# Altium footprint library Nhat_Lib.PcbLib: 84 footprints (part 3 of 6)
Each footprint in its own frame and in the unit in brackets; x right, y up, seen from the top. Pads: shape width x height; smd on the part's side, far side on the other; paste and mask are expansions set on the pad; w line width, h text height; cw(c..) or ccw(c..) is an arc to the next point about the centre after c.
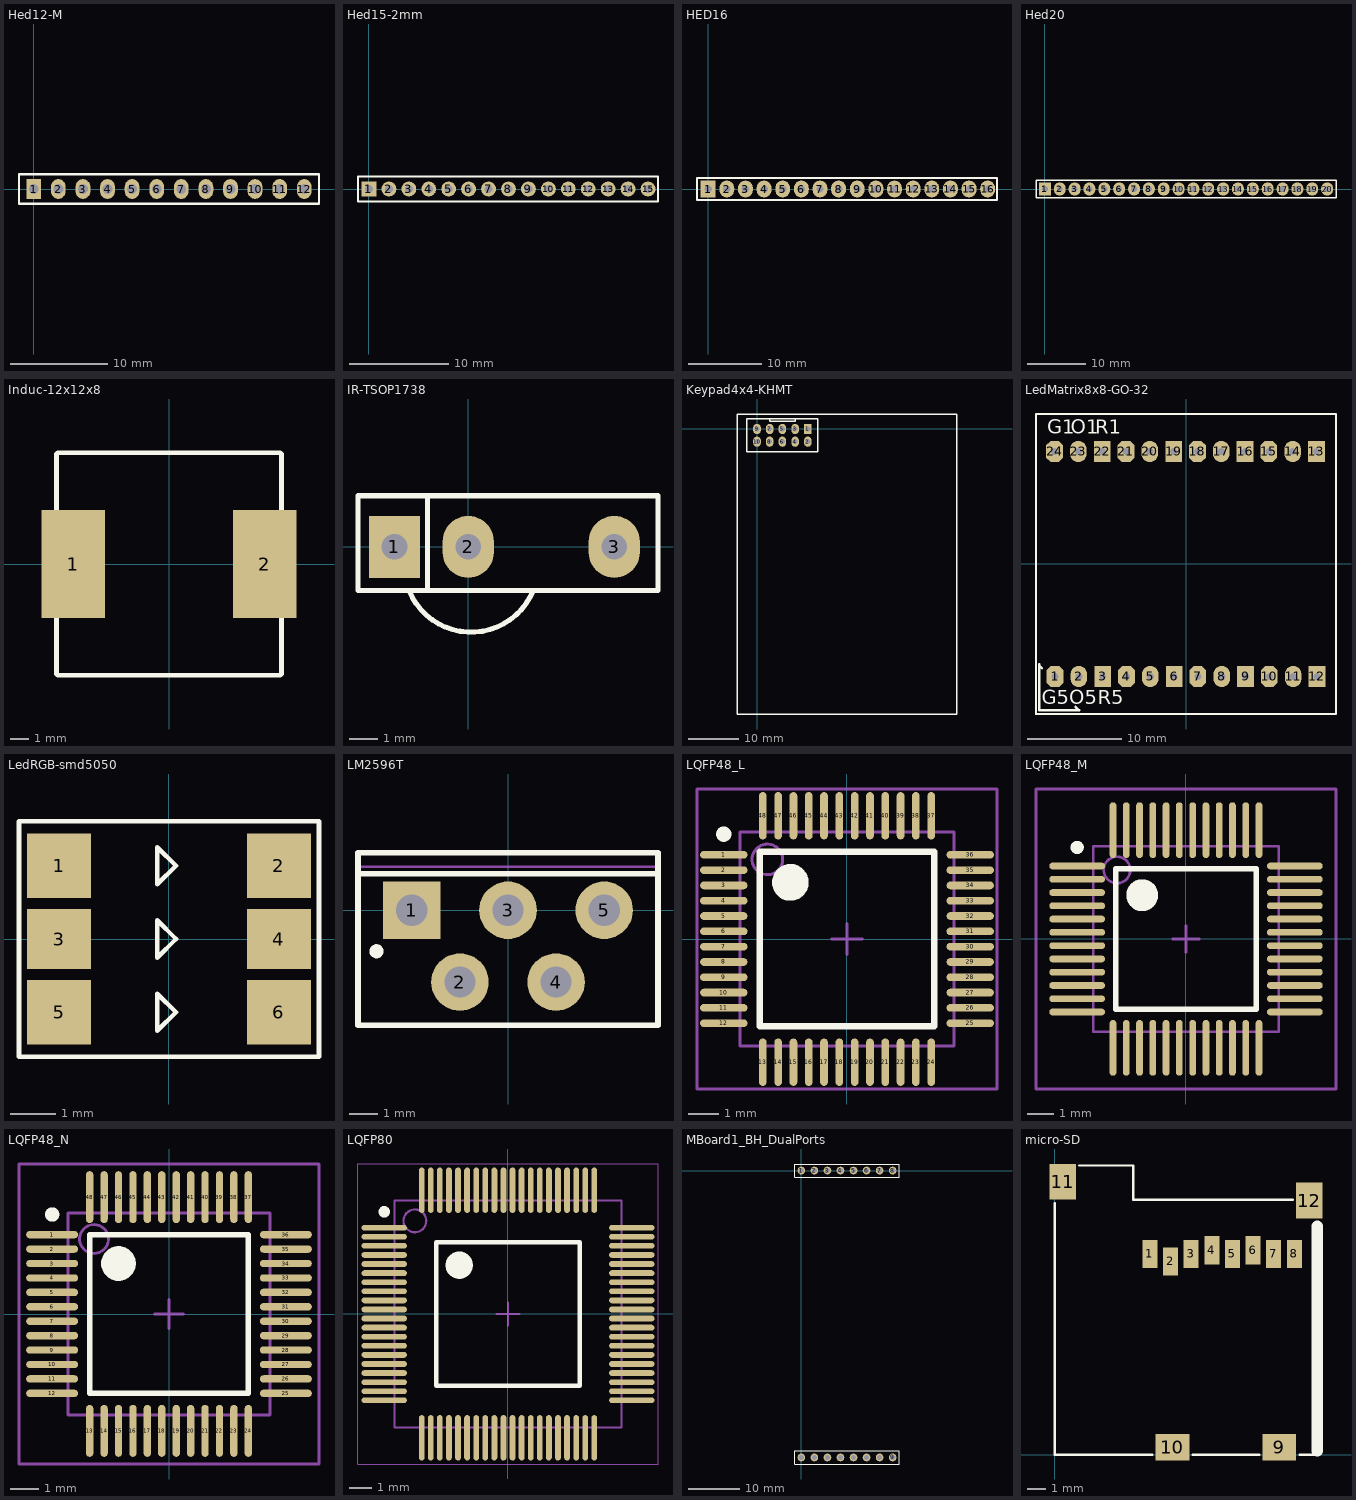
[diagram p2: the footprints below, top view; thin cyan lines are the x and y axes]

## Hed12-M [mil]
pads (12):
  rect 60x80 hole 40: 1(0,0)
  oval 60x80 hole 40: 2(100,0) 3(200,0) 4(300,0) 5(400,0) 6(500,0) 7(600,0) 8(700,0) 9(800,0) 10(900,0) 11(1000,0) 12(1100,0)
Top Overlay:
  lines w10: -60,-60 1160,-60 1160,60 -60,60 -60,-60
3D body: height 314.96, standoff -39.37, extent -10,-10 10,10
3D body: height 314.96, standoff -39.37, extent 90,-10 110,10
3D body: height 314.96, standoff -39.37, extent 190,-10 210,10
3D body: height 314.96, standoff -39.37, extent 290,-10 310,10
3D body: height 314.96, standoff -39.37, extent 390,-10 410,10
3D body: height 314.96, standoff -39.37, extent 490,-10 510,10
3D body: height 314.96, standoff -39.37, extent 590,-10 610,10
3D body: height 314.96, standoff -39.37, extent 690,-10 710,10
3D body: height 314.96, standoff -39.37, extent 790,-10 810,10
3D body: height 314.96, standoff -39.37, extent 890,-10 910,10
3D body: height 314.96, standoff -39.37, extent 990,-10 1010,10
3D body: height 314.96, standoff -39.37, extent 1090,-10 1110,10
3D body: height 78.74, standoff 0, extent -50,-50 50,50
3D body: height 78.74, standoff 0, extent 50,-50 150,50
3D body: height 78.74, standoff 0, extent 150,-50 250,50
3D body: height 78.74, standoff 0, extent 250,-50 350,50
3D body: height 78.74, standoff 0, extent 350,-50 450,50
3D body: height 78.74, standoff 0, extent 450,-50 550,50
3D body: height 78.74, standoff 0, extent 550,-50 650,50
3D body: height 78.74, standoff 0, extent 650,-50 750,50
3D body: height 78.74, standoff 0, extent 750,-50 850,50
3D body: height 78.74, standoff 0, extent 850,-50 950,50
3D body: height 78.74, standoff 0, extent 950,-50 1050,50
3D body: height 78.74, standoff 0, extent 1050,-50 1150,50

## Hed15-2mm [mm]
pads (15):
  rect 1.5x1.5 hole 0.8: 1(0,0)
  round 1.5 hole 0.8: 2(2,0) 3(4,0) 4(6,0) 5(8,0) 6(10,0) 7(12,0) 8(14,0) 9(16,0) 10(18,0) 11(20,0) 12(22,0) 13(24,0) 14(26,0) 15(28,0)
Top Overlay:
  lines w0.203: -1.1,-1.25 -1.1,1.25 29,1.25 29,-1.25 -1.1,-1.25
3D body: height 4.3, standoff 0, extent 27,-1.2 29,0
3D body: height 4.3, standoff 0, extent 27,0 29,1.2
3D body: height 4.3, standoff 0, extent 25,-1.2 27,0
3D body: height 4.3, standoff 0, extent 25,0 27,1.2
3D body: height 4.3, standoff 0, extent 23,-1.2 25,0
3D body: height 4.3, standoff 0, extent 23,0 25,1.2
3D body: height 4.3, standoff 0, extent 21,-1.2 23,0
3D body: height 4.3, standoff 0, extent 21,0 23,1.2
3D body: height 4.3, standoff 0, extent 19,-1.2 21,0
3D body: height 4.3, standoff 0, extent 19,0 21,1.2
3D body: height 4.3, standoff 0, extent -1,0 1,1.2
3D body: height 4.3, standoff 0, extent -1,-1.2 1,0
3D body: height 4.3, standoff 0, extent 1,-1.2 3,0
3D body: height 4.3, standoff 0, extent 1,0 3,1.2
3D body: height 4.3, standoff 0, extent 5,0 7,1.2
3D body: height 4.3, standoff 0, extent 5,-1.2 7,0
3D body: height 4.3, standoff 0, extent 3,-1.2 5,0
3D body: height 4.3, standoff 0, extent 3,0 5,1.2
3D body: height 4.3, standoff 0, extent 11,0 13,1.2
3D body: height 4.3, standoff 0, extent 11,-1.2 13,0
3D body: height 4.3, standoff 0, extent 13,-1.2 15,0
3D body: height 4.3, standoff 0, extent 13,0 15,1.2
3D body: height 4.3, standoff 0, extent 9,0 11,1.2
3D body: height 4.3, standoff 0, extent 9,-1.2 11,0
3D body: height 4.3, standoff 0, extent 7,-1.2 9,0
3D body: height 4.3, standoff 0, extent 7,0 9,1.2
3D body: height 4.3, standoff 0, extent 17,0 19,1.2
3D body: height 4.3, standoff 0, extent 17,-1.2 19,0
3D body: height 4.3, standoff 0, extent 15,-1.2 17,0
3D body: height 4.3, standoff 0, extent 15,0 17,1.2

## HED16 [mil]
pads (16):
  rect 80x90 hole 40: 1(0,0)
  oval 80x90 hole 40: 2(100,0) 3(200,0) 4(300,0) 5(400,0) 6(500,0) 7(600,0) 8(700,0) 9(800,0) 10(900,0) 11(1000,0) 12(1100,0) 13(1200,0) 14(1300,0) 15(1400,0) 16(1500,0)
Top Overlay:
  lines w10: 940,-60 1550,-60 1550,60 940,60 ; 960,-60 -60,-60 -60,60 960,60

## Hed20 [mil] "Header 20 pin 2.54mm"
pads (20):
  rect 80x90 hole 40: 1(0,0)
  oval 80x90 hole 40: 2(100,0) 3(200,0) 4(300,0) 5(400,0) 6(500,0) 7(600,0) 8(700,0) 9(800,0) 10(900,0) 11(1000,0) 12(1100,0) 13(1200,0) 14(1300,0) 15(1400,0) 16(1500,0) 17(1600,0) 18(1700,0) 19(1800,0) 20(1900,0)
Top Overlay:
  lines w10: 940,-60 1960,-60 1960,60 940,60 ; 960,-60 -60,-60 -60,60 960,60

## Induc-12x12x8 [mm]
pads (2):
  rect 3.5x6 smd: 1(-5.3,0) 2(5.3,0)
Top Overlay:
  lines w0.254: -6.223,-6.096 -6.223,6.096 ; -6.15,-6.15 6.15,-6.15 ; -6.15,6.15 6.15,6.15 ; 6.223,-6.096 6.223,6.096

## IR-TSOP1738 [mil]
pads (3):
  rect 70x85 hole 35: 1(-101,0)
  oval 70x85 hole 35: 2(0,0) 3(200,0)
Top Overlay:
  lines w7: -81,-60 ccw(c4,-25) 89,-60 ; -56,-60 -56,70 ; -151,-60 -151,70 260,70 260,-60 -151,-60

## Keypad4x4-KHMT [mil]
pads (10):
  rect 60x80 hole 40: 1(400,0)
  oval 60x80 hole 40: 2(400,-100) 3(300,0) 4(300,-100) 5(200,0) 6(200,-100) 7(100,0) 8(100,-100) 9(0,0) 10(0,-100)
Top Overlay:
  lines w10: 100,80 300,80 ; 100,80 100,60 300,60 300,80 ; 100,80 -80,80 -80,-180 480,-180 480,80 300,80 ; -157.48,-2244.09 -157.48,118.11 1574.8,118.11 1574.8,-2244.09 -157.48,-2244.09

## LedMatrix8x8-GO-32 [mil]
pads (24):
  oct 70x90 hole 30: 1(-550,-472.44) 4(-250,-472.44) 7(50,-472.44) 10(350,-472.44) 15(348,472.44) 18(48,472.44) 21(-252,472.44) 24(-552,472.44)
  oval 70x90 hole 30: 2(-450,-472.44) 5(-150,-472.44) 8(150,-472.44) 11(450,-472.44) 14(448,472.44) 17(148,472.44) 20(-152,472.44) 23(-452,472.44)
  rect 70x90 hole 30: 3(-350,-472.44) 6(-50,-472.44) 9(250,-472.44) 12(550,-472.44) 13(548,472.44) 16(248,472.44) 19(-52,472.44) 22(-352,472.44)
Top Overlay:
  lines w10: -629.84,-630 -629.92,-629.92 ; -605,-438 -617,-426 -617,-420 -617,-615 -449,-615 -464,-600 ; -629.92,-629.92 629.92,-629.92 629.92,629.92 -629.92,629.92 -629.92,-629.92
  text "R5" at -371,-589 h60
  text "O5" at -490,-589 h60
  text "G5" at -606,-589 h60
  text "G1" at -583,546 h60
  text "O1" at -483,546 h60
  text "R1" at -382,547 h60

## LedRGB-smd5050 [mm]
pads (6):
  rect 1.4x1.4 smd: 1(-2.4,1.6) 2(2.4,1.6) 5(-2.4,-1.6) 6(2.4,-1.6)
  rect 1.4x1.3 smd: 3(-2.4,0) 4(2.4,0)
Top Overlay:
  lines w0.1: -3.275,-2.575 -3.275,2.575 3.275,2.575 3.275,-2.575 -3.275,-2.575 ; -0.254,-2.006 -0.254,-1.194 0.152,-1.6 -0.254,-2.006 ; -0.254,-0.406 -0.254,0.407 0.152,0 -0.254,-0.406 ; -0.254,1.194 0.152,1.6 -0.254,2.007 -0.254,1.194
3D body: height 2, standoff 0, extent -2.7,-2.5 2.7,2.5

## LM2596T [mil]
pads (5):
  rect 80x80 hole 43.31: 1(-133.86,0)
  round 80 hole 43.31: 2(-66.93,-100) 3(0,0) 4(66.93,-100) 5(133.86,0)
Top Overlay:
  circle w9.84: c-183.07,-57.09 r4.92
  lines w7.87: -208.66,50.55 208.66,50.55 ; -208.66,-160 -208.66,80 208.66,80 208.66,-160 -208.66,-160
Mechanical 13:
  lines w3.94: -208.66,60.55 208.66,60.55 ; -208.66,-160 208.66,-160 208.66,80 -208.66,80 -208.66,-160
3D body: height 771.65, standoff 511.81, extent -208.66,60.18 208.62,79.82

## LQFP48_L [mm]
pads (48):
  oval 1.55x0.25 smd: 1(-4.025,2.75) 2(-4.025,2.25) 3(-4.025,1.75) 4(-4.025,1.25) 5(-4.025,0.75) 6(-4.025,0.25) 7(-4.025,-0.25) 8(-4.025,-0.75) 9(-4.025,-1.25) 10(-4.025,-1.75) 11(-4.025,-2.25) 12(-4.025,-2.75) 25(4.025,-2.75) 26(4.025,-2.25) 27(4.025,-1.75) 28(4.025,-1.25) 29(4.025,-0.75) 30(4.025,-0.25) 31(4.025,0.25) 32(4.025,0.75) 33(4.025,1.25) 34(4.025,1.75) 35(4.025,2.25) 36(4.025,2.75)
  oval 0.25x1.55 smd: 13(-2.75,-4.025) 14(-2.25,-4.025) 15(-1.75,-4.025) 16(-1.25,-4.025) 17(-0.75,-4.025) 18(-0.25,-4.025) 19(0.25,-4.025) 20(0.75,-4.025) 21(1.25,-4.025) 22(1.75,-4.025) 23(2.25,-4.025) 24(2.75,-4.025) 37(2.75,4.025) 38(2.25,4.025) 39(1.75,4.025) 40(1.25,4.025) 41(0.75,4.025) 42(0.25,4.025) 43(-0.25,4.025) 44(-0.75,4.025) 45(-1.25,4.025) 46(-1.75,4.025) 47(-2.25,4.025) 48(-2.75,4.025)
Top Overlay:
  circle w0.6: c-1.85,1.85 r0.3
  circle w0.25: c-4.025,3.425 r0.125
  lines w0.2: -2.85,-2.85 2.85,-2.85 2.85,2.85 -2.85,2.85 -2.85,-2.85
Mechanical 13:
  circle w0.1: c-2.6,2.6 r0.5
  lines w0.1: -3.5,-3.5 3.5,-3.5 3.5,3.5 -3.5,3.5 -3.5,-3.5
Mechanical 15:
  lines w0.1: -0.5,0 0.5,0 ; 0,-0.5 0,0.5 ; -4.9,-4.9 4.9,-4.9 4.9,4.9 -4.9,4.9 -4.9,-4.9
3D body: height 1.6, standoff 0, extent -3.5,-3.5 3.5,3.5

## LQFP48_M [mm]
pads (48):
  oval 2.1x0.254 smd: 1(-4.1,2.75) 2(-4.1,2.25) 3(-4.1,1.75) 4(-4.1,1.25) 5(-4.1,0.75) 6(-4.1,0.25) 7(-4.1,-0.25) 8(-4.1,-0.75) 9(-4.1,-1.25) 10(-4.1,-1.75) 11(-4.1,-2.25) 12(-4.1,-2.75) 25(4.1,-2.75) 26(4.1,-2.25) 27(4.1,-1.75) 28(4.1,-1.25) 29(4.1,-0.75) 30(4.1,-0.25) 31(4.1,0.25) 32(4.1,0.75) 33(4.1,1.25) 34(4.1,1.75) 35(4.1,2.25) 36(4.1,2.75)
  oval 0.254x2.1 smd: 13(-2.75,-4.1) 14(-2.25,-4.1) 15(-1.75,-4.1) 16(-1.25,-4.1) 17(-0.75,-4.1) 18(-0.25,-4.1) 19(0.25,-4.1) 20(0.75,-4.1) 21(1.25,-4.1) 22(1.75,-4.1) 23(2.25,-4.1) 24(2.75,-4.1) 37(2.75,4.1) 38(2.25,4.1) 39(1.75,4.1) 40(1.25,4.1) 41(0.75,4.1) 42(0.25,4.1) 43(-0.25,4.1) 44(-0.75,4.1) 45(-1.25,4.1) 46(-1.75,4.1) 47(-2.25,4.1) 48(-2.75,4.1)
Top Overlay:
  circle w0.6: c-1.65,1.65 r0.3
  circle w0.25: c-4.1,3.45 r0.125
  lines w0.2: -2.65,-2.65 2.65,-2.65 2.65,2.65 -2.65,2.65 -2.65,-2.65
Mechanical 13:
  circle w0.1: c-2.6,2.6 r0.5
  lines w0.1: -3.5,-3.5 3.5,-3.5 3.5,3.5 -3.5,3.5 -3.5,-3.5
Mechanical 15:
  lines w0.1: -0.5,0 0.5,0 ; 0,-0.5 0,0.5 ; -5.65,-5.65 5.65,-5.65 5.65,5.65 -5.65,5.65 -5.65,-5.65
3D body: height 1.6, standoff 0, extent -3.5,-3.5 3.5,3.5

## LQFP48_N [mm]
pads (48):
  oval 1.8x0.254 smd: 1(-4.05,2.75) 2(-4.05,2.25) 3(-4.05,1.75) 4(-4.05,1.25) 5(-4.05,0.75) 6(-4.05,0.25) 7(-4.05,-0.25) 8(-4.05,-0.75) 9(-4.05,-1.25) 10(-4.05,-1.75) 11(-4.05,-2.25) 12(-4.05,-2.75) 25(4.05,-2.75) 26(4.05,-2.25) 27(4.05,-1.75) 28(4.05,-1.25) 29(4.05,-0.75) 30(4.05,-0.25) 31(4.05,0.25) 32(4.05,0.75) 33(4.05,1.25) 34(4.05,1.75) 35(4.05,2.25) 36(4.05,2.75)
  oval 0.254x1.8 smd: 13(-2.75,-4.05) 14(-2.25,-4.05) 15(-1.75,-4.05) 16(-1.25,-4.05) 17(-0.75,-4.05) 18(-0.25,-4.05) 19(0.25,-4.05) 20(0.75,-4.05) 21(1.25,-4.05) 22(1.75,-4.05) 23(2.25,-4.05) 24(2.75,-4.05) 37(2.75,4.05) 38(2.25,4.05) 39(1.75,4.05) 40(1.25,4.05) 41(0.75,4.05) 42(0.25,4.05) 43(-0.25,4.05) 44(-0.75,4.05) 45(-1.25,4.05) 46(-1.75,4.05) 47(-2.25,4.05) 48(-2.75,4.05)
Top Overlay:
  circle w0.6: c-1.75,1.75 r0.3
  circle w0.25: c-4.05,3.45 r0.125
  lines w0.2: -2.75,-2.75 2.75,-2.75 2.75,2.75 -2.75,2.75 -2.75,-2.75
Mechanical 13:
  circle w0.1: c-2.6,2.6 r0.5
  lines w0.1: -3.5,-3.5 3.5,-3.5 3.5,3.5 -3.5,3.5 -3.5,-3.5
Mechanical 15:
  lines w0.1: -0.5,0 0.5,0 ; 0,-0.5 0,0.5 ; -5.2,-5.2 5.2,-5.2 5.2,5.2 -5.2,5.2 -5.2,-5.2
3D body: height 1.6, standoff 0, extent -3.5,-3.5 3.5,3.5

## LQFP80 [mm] "TSQFP, 80-Leads, Body 10.00x10.00mm, Pitch 0.40mm, IPC Medium Density"
height 1.6
pads (80):
  oval 2x0.254 smd: 1(-5.45,3.8) 2(-5.45,3.4) 3(-5.45,3) 4(-5.45,2.6) 5(-5.45,2.2) 6(-5.45,1.8) 7(-5.45,1.4) 8(-5.45,1) 9(-5.45,0.6) 10(-5.45,0.2) 11(-5.45,-0.2) 12(-5.45,-0.6) 13(-5.45,-1) 14(-5.45,-1.4) 15(-5.45,-1.8) 16(-5.45,-2.2) 17(-5.45,-2.6) 18(-5.45,-3) 19(-5.45,-3.4) 20(-5.45,-3.8) 41(5.45,-3.8) 42(5.45,-3.4) 43(5.45,-3) 44(5.45,-2.6) 45(5.45,-2.2) 46(5.45,-1.8) 47(5.45,-1.4) 48(5.45,-1) 49(5.45,-0.6) 50(5.45,-0.2) 51(5.45,0.2) 52(5.45,0.6) 53(5.45,1) 54(5.45,1.4) 55(5.45,1.8) 56(5.45,2.2) 57(5.45,2.6) 58(5.45,3) 59(5.45,3.4) 60(5.45,3.8)
  oval 0.254x2 smd: 21(-3.8,-5.45) 22(-3.4,-5.45) 23(-3,-5.45) 24(-2.6,-5.45) 25(-2.2,-5.45) 26(-1.8,-5.45) 27(-1.4,-5.45) 28(-1,-5.45) 29(-0.6,-5.45) 30(-0.2,-5.45) 31(0.2,-5.45) 32(0.6,-5.45) 33(1,-5.45) 34(1.4,-5.45) 35(1.8,-5.45) 36(2.2,-5.45) 37(2.6,-5.45) 38(3,-5.45) 39(3.4,-5.45) 40(3.8,-5.45) 61(3.8,5.45) 62(3.4,5.45) 63(3,5.45) 64(2.6,5.45) 65(2.2,5.45) 66(1.8,5.45) 67(1.4,5.45) 68(1,5.45) 69(0.6,5.45) 70(0.2,5.45) 71(-0.2,5.45) 72(-0.6,5.45) 73(-1,5.45) 74(-1.4,5.45) 75(-1.8,5.45) 76(-2.2,5.45) 77(-2.6,5.45) 78(-3,5.45) 79(-3.4,5.45) 80(-3.8,5.45)
Top Overlay:
  circle w0.25: c-5.45,4.5 r0.125
  circle w0.6: c-2.15,2.15 r0.3
  lines w0.2: -3.15,-3.15 -3.15,3.15 3.15,3.15 3.15,-3.15 -3.15,-3.15
Mechanical 13:
  circle w0.1: c-4.1,4.1 r0.5
  lines w0.1: -5,-5 -5,5 5,5 5,-5 -5,-5
Mechanical 15:
  lines w0.05: -6.604,-6.604 -6.604,6.604 6.604,6.604 6.604,-6.604 -6.604,-6.604
  lines w0.1: -0.5,0 0.5,0 ; 0,-0.5 0,0.5
3D body: height 1.6, standoff 0, extent -6.008,-6.008 6.009,6.009

## MBoard1_BH_DualPorts [mm]
pads (16):
  round 1.5 hole 1.02: 1(0,0) 2(2.54,0) 3(5.08,0) 4(7.62,0) 5(10.16,0) 6(12.7,0) 7(15.24,0) 8(17.78,0) 9(17.78,-55.88) 10(15.24,-55.88) 11(12.7,-55.88) 12(10.16,-55.88) 13(7.62,-55.88) 14(5.08,-55.88) 15(2.54,-55.88) 16(0,-55.88)
Top Overlay:
  lines w0.203: -1.27,-57.15 19.05,-57.15 19.05,-54.61 -1.27,-54.61 -1.27,-57.15 ; -1.27,-1.27 -1.27,1.27 19.05,1.27 19.05,-1.27 -1.27,-1.27
3D body: height 8, standoff -1, extent -0.254,-0.254 0.254,0.254
3D body: height 8, standoff -1, extent 2.286,-0.254 2.794,0.254
3D body: height 8, standoff -1, extent 4.826,-0.254 5.334,0.254
3D body: height 8, standoff -1, extent 7.366,-0.254 7.874,0.254
3D body: height 8, standoff -1, extent 9.906,-0.254 10.414,0.254
3D body: height 8, standoff -1, extent 17.526,-0.254 18.034,0.254
3D body: height 8, standoff -1, extent 14.986,-0.254 15.494,0.254
3D body: height 8, standoff -1, extent 12.446,-0.254 12.954,0.254
3D body: height 8, standoff -1, extent 7.366,-56.134 7.874,-55.626
3D body: height 8, standoff -1, extent 4.826,-56.134 5.334,-55.626
3D body: height 8, standoff -1, extent 2.286,-56.134 2.794,-55.626
3D body: height 8, standoff -1, extent -0.254,-56.134 0.254,-55.626
3D body: height 8, standoff -1, extent 17.526,-56.134 18.034,-55.626
3D body: height 8, standoff -1, extent 14.986,-56.134 15.494,-55.626
3D body: height 8, standoff -1, extent 12.446,-56.134 12.954,-55.626
3D body: height 8, standoff -1, extent 9.906,-56.134 10.414,-55.626
3D body: height 2, standoff 0, extent -1.27,-1.27 1.27,1.27
3D body: height 2, standoff 0, extent 1.27,-1.27 3.81,1.27
3D body: height 2, standoff 0, extent 3.81,-1.27 6.35,1.27
3D body: height 2, standoff 0, extent 6.35,-1.27 8.89,1.27
3D body: height 2, standoff 0, extent 8.89,-1.27 11.43,1.27
3D body: height 2, standoff 0, extent 16.51,-1.27 19.05,1.27
3D body: height 2, standoff 0, extent 13.97,-1.27 16.51,1.27
3D body: height 2, standoff 0, extent 11.43,-1.27 13.97,1.27
3D body: height 2, standoff 0, extent 6.35,-57.15 8.89,-54.61
3D body: height 2, standoff 0, extent 3.81,-57.15 6.35,-54.61
3D body: height 2, standoff 0, extent 1.27,-57.15 3.81,-54.61
3D body: height 2, standoff 0, extent -1.27,-57.15 1.27,-54.61
3D body: height 2, standoff 0, extent 16.51,-57.15 19.05,-54.61
3D body: height 2, standoff 0, extent 13.97,-57.15 16.51,-54.61
3D body: height 2, standoff 0, extent 11.43,-57.15 13.97,-54.61
3D body: height 2, standoff 0, extent 8.89,-57.15 11.43,-54.61

## micro-SD [mm]
pads (12):
  rect 0.8x1.5 smd: 1(5.08,10.703) 2(6.18,10.303) 3(7.28,10.703) 4(8.38,10.903) 5(9.48,10.703) 6(10.58,10.903) 7(11.68,10.703) 8(12.78,10.703)
  rect 1.8x1.4 smd: 9(11.98,0.403) 10(6.28,0.403)
  rect 1.4x1.9 smd: 11(0.43,14.553) 12(13.58,13.553)
Top Overlay:
  lines w0.127: 0,13.421 0,0.003 5.207,0.003 ; 1.311,15.42 4.2,15.42 4.2,13.604 12.708,13.604 ; 7.366,0.003 10.922,0.003 ; 13.058,0.003 13.9,0.003
  lines w0.6: 14,0.203 14,12.182
3D body: height 1.85, standoff -0.05, extent -0.077,-0.07 14.173,15.13